# Altium footprint library 3D_MIG_Controller.PCBLIB: 560 footprints (part 17 of 35)
Each footprint in its own frame and in the unit in brackets; x right, y up, seen from the top. Pads: shape width x height; smd on the part's side, far side on the other; paste and mask are expansions set on the pad; w line width, h text height; cw(c..) or ccw(c..) is an arc to the next point about the centre after c.
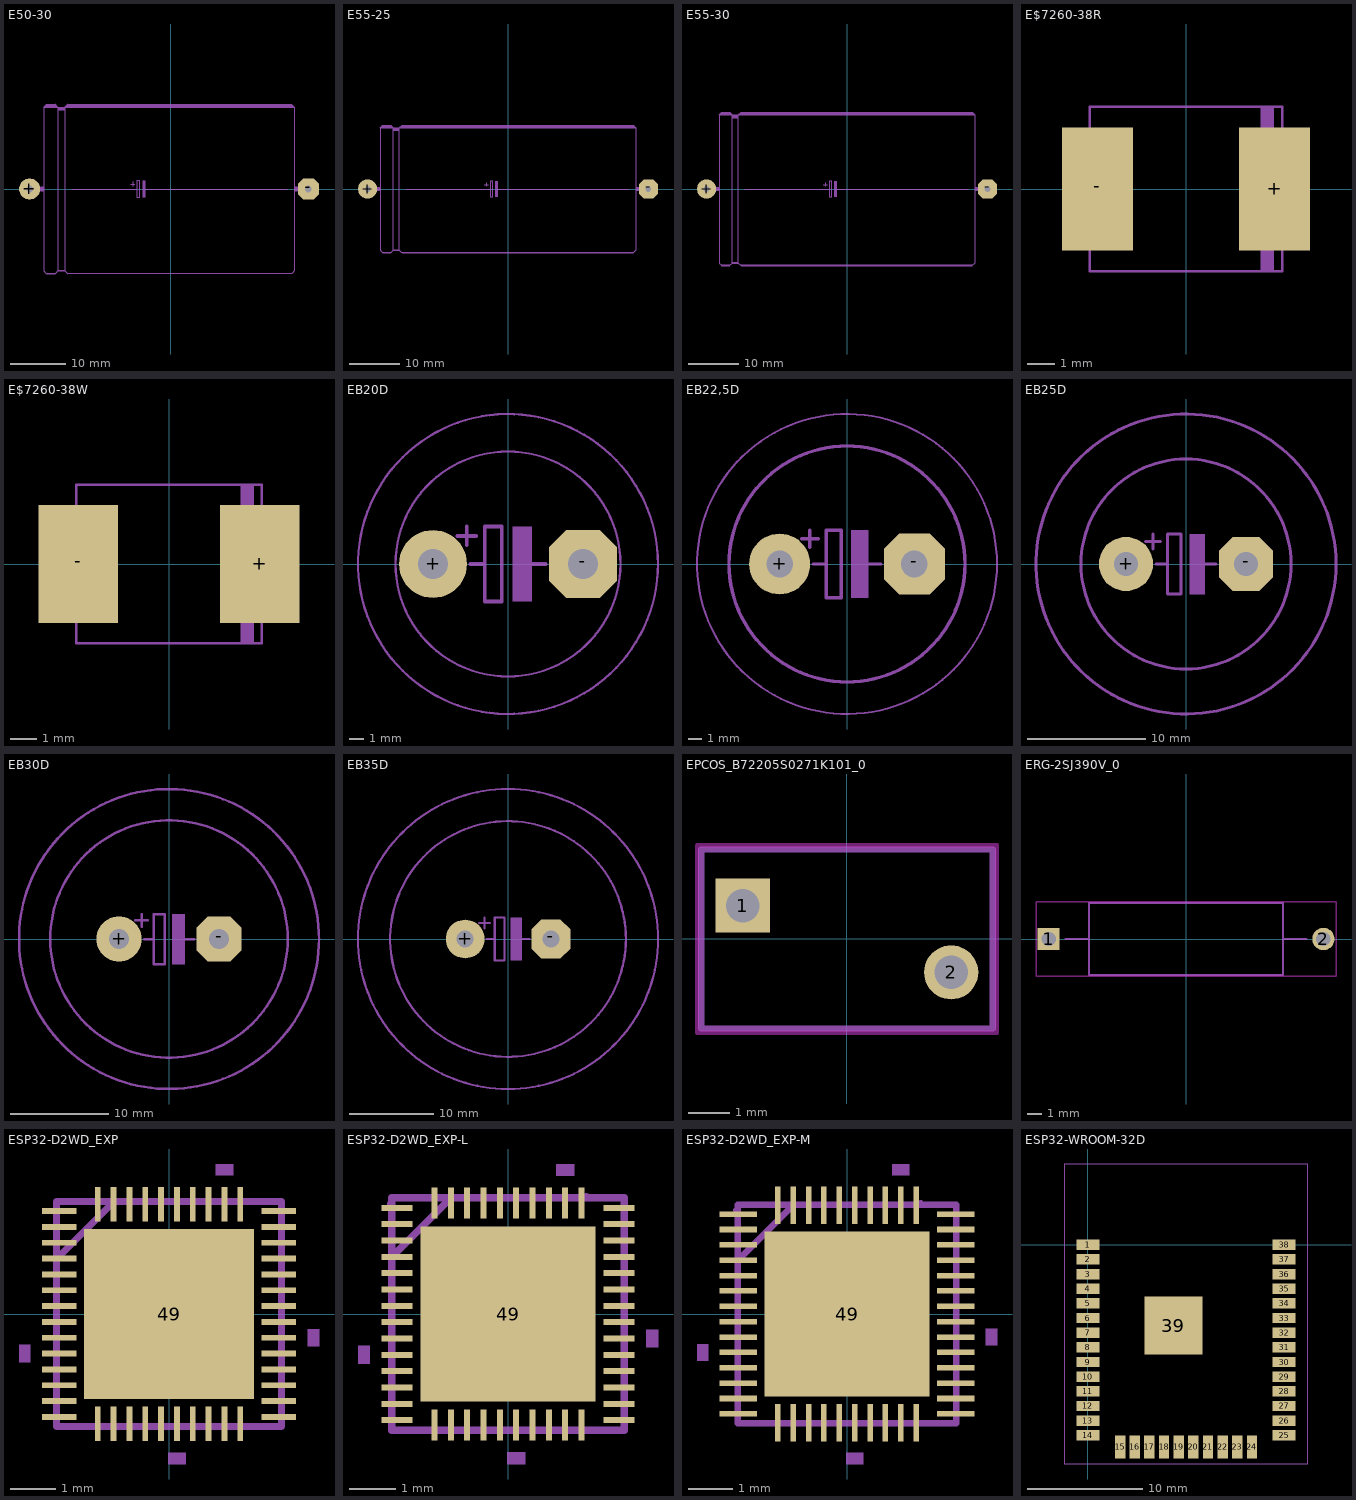
[diagram p16: the footprints below, top view; thin cyan lines are the x and y axes]

## E50-30 [mil]
pads (2):
  round 150 hole 47: +(-1000,0)
  oct 150x150 / inner round 138.58 / far side oct 150x150 hole 47: -(975,0)
tDocu:
  lines w30: -1000,0 -925,0 ; 900,0 975,0
tPlace:
  region: -200,-60 -200,60 -180,60 -180,-60
  region: 875,-15 875,15 895,15 895,-15
  region: -920,-15 -920,15 -900,15 -900,-15
  lines w6: -820,-598 -880,-598 -880,-600 ; -700,0 -240,0 ; -285,35 -255,35 ; -270,20 -270,50 ; -185,0 825,0 ; 855,-598 -730,-598 -730,-600 ; -900,580 -880,600 -820,600 -800,580 ; -900,580 -900,-580 -885,-595 ; -900,580 -800,580 ; -885,-595 -815,-595 ; -885,-595 -880,-600 ; -880,-600 -820,-600 -815,-595 ; -815,-595 -800,-580 ; -800,-580 -750,-580 ; -800,-580 -800,-578 ; -800,-578 -800,-575 ; -800,-578 -750,-578 ; -800,-575 -800,560 ; -800,-575 -750,-575 ; -800,560 -800,580 ; -800,560 -750,560 ; -800,580 -750,580 ; -750,-580 -735,-595 ; -750,-580 -750,-578 ; -750,-578 -750,-575 ; -750,-575 -750,560 ; -750,560 -750,580 ; -750,580 -730,600 855,600 875,580 ; -750,580 875,580 ; -735,-595 860,-595 ; -735,-595 -730,-600 ; -730,-600 855,-600 860,-595 ; -240,0 -240,60 -220,60 -220,-60 -240,-60 -240,0 ; 860,-595 875,-580 875,580
  lines w12: -890,585 -885,585 ; -885,590 -885,585 ; -880,595 -820,595 ; -815,590 -815,585 ; -810,585 -815,585 ; -795,565 -755,565 ; -795,575 -755,575 ; -740,585 -735,585 ; -735,590 -735,585 ; -730,595 855,595 ; 865,585 -735,585 ; -885,585 -815,585

## E55-25 [mil]
pads (2):
  round 150 hole 44: +(-1100,0)
  oct 150x150 / inner round 138.58 / far side oct 150x150 hole 44: -(1100,0)
tDocu:
  lines w30: -1100,0 -1025,0 ; 1025,0 1100,0
tPlace:
  region: -100,-60 -100,60 -80,60 -80,-60
  region: 1000,-15 1000,15 1020,15 1020,-15
  region: -1020,-15 -1020,15 -1000,15 -1000,-15
  lines w6: -920,-498 -980,-498 -980,-500 ; -800,0 -140,0 ; -185,35 -155,35 ; -170,20 -170,50 ; -85,0 950,0 ; 980,-498 -830,-498 -830,-500 ; -1000,480 -980,500 -920,500 -900,480 ; -1000,480 -1000,-480 -985,-495 ; -1000,480 -900,480 ; -985,-495 -915,-495 ; -985,-495 -980,-500 ; -980,-500 -920,-500 -915,-495 ; -915,-495 -900,-480 ; -900,-480 -850,-480 ; -900,-480 -900,-478 ; -900,-478 -850,-478 ; -900,-478 -900,-475 ; -900,-475 -850,-475 ; -900,-475 -900,460 ; -900,460 -900,480 ; -900,460 -850,460 ; -900,480 -850,480 ; -850,-480 -850,-478 ; -850,-480 -835,-495 ; -850,-478 -850,-475 ; -850,-475 -850,460 ; -850,460 -850,480 ; -850,480 -830,500 980,500 1000,480 ; -850,480 1000,480 ; -835,-495 -830,-500 ; -835,-495 985,-495 ; -830,-500 980,-500 985,-495 ; -140,0 -140,60 -120,60 -120,-60 -140,-60 -140,0 ; 985,-495 1000,-480 1000,480
  lines w12: -990,485 -910,485 ; -980,495 -920,495 ; -895,465 -855,465 ; -895,475 -855,475 ; -840,485 990,485 ; -830,495 980,495

## E55-30 [mil]
pads (2):
  round 150 hole 47: +(-1100,0)
  oct 150x150 / inner round 138.58 / far side oct 150x150 hole 47: -(1100,0)
tDocu:
  lines w30: -1100,0 -1025,0 ; 1025,0 1100,0
tPlace:
  region: -100,-60 -100,60 -80,60 -80,-60
  region: 1000,-15 1000,15 1020,15 1020,-15
  region: -1020,-15 -1020,15 -1000,15 -1000,-15
  lines w6: -920,-598 -980,-598 -980,-600 ; -800,0 -140,0 ; -185,35 -155,35 ; -170,20 -170,50 ; -85,0 950,0 ; 980,-598 -830,-598 -830,-600 ; -1000,580 -980,600 -920,600 -900,580 ; -1000,580 -1000,-580 -985,-595 ; -1000,580 -900,580 ; -985,-595 -915,-595 ; -985,-595 -980,-600 ; -980,-600 -920,-600 -915,-595 ; -915,-595 -900,-580 ; -900,-580 -850,-580 ; -900,-580 -900,-578 ; -900,-578 -850,-578 ; -900,-578 -900,-575 ; -900,-575 -850,-575 ; -900,-575 -900,560 ; -900,560 -900,580 ; -900,560 -850,560 ; -900,580 -850,580 ; -850,-580 -850,-578 ; -850,-580 -835,-595 ; -850,-578 -850,-575 ; -850,-575 -850,560 ; -850,560 -850,580 ; -850,580 -830,600 980,600 1000,580 ; -850,580 1000,580 ; -835,-595 -830,-600 ; -835,-595 985,-595 ; -830,-600 980,-600 985,-595 ; -140,0 -140,60 -120,60 -120,-60 -140,-60 -140,0 ; 985,-595 1000,-580 1000,580
  lines w12: -990,585 -910,585 ; -980,595 -920,595 ; -895,565 -855,565 ; -895,575 -855,575 ; -840,585 990,585 ; -830,595 980,595

## E$7260-38R [mil]
pads (2):
  rect 100.39x173.23 smd: +(125,0) -(-125,0)
tDocu:
  region: -143.7,-80.71 -143.7,80.71 -137.8,80.71 -137.8,-80.71
  region: 137.8,-80.71 137.8,80.71 143.7,80.71 143.7,-80.71
  region: 105.32,-117.13 105.32,117.13 124.02,117.13 124.02,-117.13
  lines w4: -135.83,-116.14 135.83,-116.14 135.83,116.14 -135.83,116.14 -135.83,-116.14

## E$7260-38W [mil]
pads (2):
  rect 116.14x173.23 smd: +(132.87,0) -(-132.87,0)
tDocu:
  region: -143.7,-80.71 -143.7,80.71 -137.8,80.71 -137.8,-80.71
  region: 137.8,-80.71 137.8,80.71 143.7,80.71 143.7,-80.71
  region: 105.32,-117.13 105.32,117.13 124.02,117.13 124.02,-117.13
  lines w4: -135.83,-116.14 135.83,-116.14 135.83,116.14 -135.83,116.14 -135.83,-116.14

## EB20D [mil]
pads (2):
  round 181 hole 79: +(-200,0)
  oct 181x181 / inner round 167.22 / far side oct 181x181 hole 79: -(200,0)
tPlace:
  circle w6: c0,0 r400
  circle w6: c0,0 r300
  region: 13,-100 13,100 63,100 63,-100
  lines w10: -135,75 -85,75 ; -110,50 -110,100 ; -100,0 -62,0 ; 25,0 100,0 ; -62,0 -62,100 -17,100 -17,-100 -62,-100 -62,0

## EB22,5D [mil]
pads (2):
  round 181 hole 79: +(-200,0)
  oct 181x181 / inner round 167.22 / far side oct 181x181 hole 79: -(200,0)
tPlace:
  circle w10: c0,0 r350
  circle w6: c0,0 r445
  region: 13,-100 13,100 63,100 63,-100
  lines w10: -135,75 -85,75 ; -110,50 -110,100 ; -100,0 -62,0 ; 25,0 100,0 ; -62,0 -62,100 -17,100 -17,-100 -62,-100 -62,0

## EB25D [mil]
pads (2):
  round 181 hole 79: +(-200,0)
  oct 181x181 / inner round 167.22 / far side oct 181x181 hole 79: -(200,0)
tPlace:
  circle w10: c0,0 r500
  circle w10: c0,0 r350
  region: 13,-100 13,100 63,100 63,-100
  lines w10: -135,75 -85,75 ; -110,50 -110,100 ; -100,0 -62,0 ; 25,0 100,0 ; -62,0 -62,100 -17,100 -17,-100 -62,-100 -62,0

## EB30D [mil]
pads (2):
  round 181 hole 79: +(-200,0)
  oct 181x181 / inner round 167.22 / far side oct 181x181 hole 79: -(200,0)
tPlace:
  circle w10: c0,0 r600
  circle w10: c0,0 r475
  region: 13,-100 13,100 63,100 63,-100
  lines w10: -135,75 -85,75 ; -110,50 -110,100 ; -100,0 -62,0 ; 25,0 100,0 ; -62,0 -62,100 -17,100 -17,-100 -62,-100 -62,0

## EB35D [mil]
pads (2):
  round 181 hole 79: +(-200,0)
  oct 181x181 / inner round 167.22 / far side oct 181x181 hole 79: -(200,0)
tPlace:
  circle w10: c0,0 r700
  circle w10: c0,0 r550
  region: 13,-100 13,100 63,100 63,-100
  lines w10: -135,75 -85,75 ; -110,50 -110,100 ; -100,0 -62,0 ; 55,0 100,0 ; -62,0 -62,100 -17,100 -17,-100 -62,-100 -62,0

## EPCOS_B72205S0271K101_0 [mil]
pads (2):
  rect 51.18x51.18 / inner round 47.28 / far side rect 51.18x51.18 hole 31.5: 1(-98.43,31.5)
  round 51.18 hole 31.5: 2(98.43,-31.5)
Top keep-out:
  lines w3.94: -141.73,-88.58 -141.73,88.58 141.73,88.58 141.73,-88.58 -141.73,-88.58
tDocu:
  lines w5.91: -137.8,-84.65 -137.8,84.65 137.8,84.65 137.8,-84.65 -137.8,-84.65
tPlace:
  lines w5.91: -137.8,-8.86 -137.8,-84.65 137.8,-84.65 137.8,-71.85 ; -137.8,71.85 -137.8,84.65 137.8,84.65 137.8,8.86

## ERG-2SJ390V_0 [mm]
pads (2):
  rect 1.55x1.55 / inner round 1.432 / far side rect 1.55x1.55 hole 1: 1(-9.555,0)
  round 1.55 hole 1: 2(9.555,0)
Top keep-out:
  lines w0.1: -10.43,-2.6 -10.43,2.6 10.43,2.6 10.43,-2.6 -10.43,-2.6
tDocu:
  lines w0.15: -6.75,-2.5 -6.75,2.5 6.75,2.5 6.75,-2.5 -6.75,-2.5
tPlace:
  lines w0.15: -8.38,0 -6.75,0 ; 6.75,0 8.38,0 ; -6.75,-2.5 -6.75,2.5 6.75,2.5 6.75,-2.5 -6.75,-2.5

## ESP32-D2WD_EXP [mil]
pads (49):
  rect 30x5 smd: 1(-95.5,89.57) 2(-95.5,75.79) 3(-95.5,62.01) 4(-95.5,48.23) 5(-95.5,34.45) 6(-95.5,20.67) 7(-95.5,6.89) 8(-95.5,-6.89) 9(-95.5,-20.67) 10(-95.5,-34.45) 11(-95.5,-48.23) 12(-95.5,-62.01) 13(-95.5,-75.79) 14(-95.5,-89.57) 25(95.5,-89.57) 26(95.5,-75.79) 27(95.5,-62.01) 28(95.5,-48.23) 29(95.5,-34.45) 30(95.5,-20.67) 31(95.5,-6.89) 32(95.5,6.89) 33(95.5,20.67) 34(95.5,34.45) 35(95.5,48.23) 36(95.5,62.01) 37(95.5,75.79) 38(95.5,89.57)
  rect 5x30 smd: 15(-62.01,-95.5) 16(-48.23,-95.5) 17(-34.45,-95.5) 18(-20.67,-95.5) 19(-6.89,-95.5) 20(6.89,-95.5) 21(20.67,-95.5) 22(34.45,-95.5) 23(48.23,-95.5) 24(62.01,-95.5) 39(62.01,95.5) 40(48.23,95.5) 41(34.45,95.5) 42(20.67,95.5) 43(6.89,95.5) 44(-6.89,95.5) 45(-20.67,95.5) 46(-34.45,95.5) 47(-48.23,95.5) 48(-62.01,95.5)
  rect 148x148 smd paste+0: 49(0,0)
Top Paste:
  region: -70.06,70.06 -70.06,3.94 -3.94,3.94 -3.94,70.06
  region: -70.06,-3.94 -70.06,-70.06 -3.94,-70.06 -3.94,-3.94
  region: 3.94,70.06 3.94,3.94 70.06,3.94 70.06,70.06
  region: 3.94,-3.94 3.94,-70.06 70.06,-70.06 70.06,-3.94
tDocu:
  lines w6: -98,-93 -98,-86 ; -98,-79 -98,-72 ; -98,-66 -98,-59 ; -98,-52 -98,-45 ; -98,-38 -98,-31 ; -98,-24 -98,-17 ; -98,-10 -98,-3 ; -98,3 -98,10 ; -98,17 -98,24 ; -98,31 -98,38 ; -98,45 -98,52 ; -98,48 -48,98 ; -98,59 -98,66 ; -98,72 -98,79 ; -98,86 -98,93 ; -66,-98 -59,-98 ; -66,98 -59,98 ; -52,-98 -45,-98 ; -52,98 -45,98 ; -38,-98 -31,-98 ; -38,98 -31,98 ; -24,-98 -17,-98 ; -24,98 -17,98 ; -10,-98 -3,-98 ; -10,98 -3,98 ; 3,-98 10,-98 ; 3,98 10,98 ; 17,-98 24,-98 ; 17,98 24,98 ; 31,-98 38,-98 ; 31,98 38,98 ; 45,-98 52,-98 ; 45,98 52,98 ; 59,-98 66,-98 ; 59,98 66,98 ; 98,-93 98,-86 ; 98,-79 98,-72 ; 98,-66 98,-59 ; 98,-52 98,-45 ; 98,-38 98,-31 ; 98,-24 98,-17 ; 98,-10 98,-3 ; 98,3 98,10 ; 98,17 98,24 ; 98,31 98,38 ; 98,45 98,52 ; 98,59 98,66 ; 98,72 98,79 ; 98,86 98,93 ; -98,-98 98,-98 98,98 -98,98 -98,-98
  text "*" at -103,71 h77.5
tPlace:
  region: -130.5,-26.95 -130.5,-41.95 -120.5,-41.95 -120.5,-26.95
  region: -0.61,-120.5 -0.61,-130.5 14.39,-130.5 14.39,-120.5
  region: 130.5,-13.17 130.5,-28.17 120.5,-28.17 120.5,-13.17
  region: 40.73,120.5 40.73,130.5 55.73,130.5 55.73,120.5
  text "*" at -158,71 h77.5

## ESP32-D2WD_EXP-L [mil]
pads (49):
  rect 26x5 smd: 1(-93.5,89.57) 2(-93.5,75.79) 3(-93.5,62.01) 4(-93.5,48.23) 5(-93.5,34.45) 6(-93.5,20.67) 7(-93.5,6.89) 8(-93.5,-6.89) 9(-93.5,-20.67) 10(-93.5,-34.45) 11(-93.5,-48.23) 12(-93.5,-62.01) 13(-93.5,-75.79) 14(-93.5,-89.57) 25(93.5,-89.57) 26(93.5,-75.79) 27(93.5,-62.01) 28(93.5,-48.23) 29(93.5,-34.45) 30(93.5,-20.67) 31(93.5,-6.89) 32(93.5,6.89) 33(93.5,20.67) 34(93.5,34.45) 35(93.5,48.23) 36(93.5,62.01) 37(93.5,75.79) 38(93.5,89.57)
  rect 5x26 smd: 15(-62.01,-93.5) 16(-48.23,-93.5) 17(-34.45,-93.5) 18(-20.67,-93.5) 19(-6.89,-93.5) 20(6.89,-93.5) 21(20.67,-93.5) 22(34.45,-93.5) 23(48.23,-93.5) 24(62.01,-93.5) 39(62.01,93.5) 40(48.23,93.5) 41(34.45,93.5) 42(20.67,93.5) 43(6.89,93.5) 44(-6.89,93.5) 45(-20.67,93.5) 46(-34.45,93.5) 47(-48.23,93.5) 48(-62.01,93.5)
  rect 148x148 smd paste+0: 49(0,0)
Top Paste:
  region: -70.06,70.06 -70.06,3.94 -3.94,3.94 -3.94,70.06
  region: -70.06,-3.94 -70.06,-70.06 -3.94,-70.06 -3.94,-3.94
  region: 3.94,70.06 3.94,3.94 70.06,3.94 70.06,70.06
  region: 3.94,-3.94 3.94,-70.06 70.06,-70.06 70.06,-3.94
tDocu:
  lines w6: -99,93 -98,86 ; -98,-93 -98,-86 ; -98,-79 -98,-72 ; -98,-66 -98,-59 ; -98,-52 -98,-45 ; -98,-38 -98,-31 ; -98,-24 -98,-17 ; -98,-10 -98,-3 ; -98,3 -98,10 ; -98,17 -98,24 ; -98,31 -98,38 ; -98,45 -98,52 ; -98,48 -48,98 ; -98,59 -98,66 ; -98,72 -98,79 ; -66,-98 -59,-98 ; -66,98 -59,98 ; -52,-98 -45,-98 ; -52,98 -45,98 ; -38,-98 -31,-98 ; -38,98 -31,98 ; -24,-98 -17,-98 ; -24,98 -17,98 ; -10,-98 -3,-98 ; -10,98 -3,98 ; 3,-98 10,-98 ; 3,98 10,98 ; 17,-98 24,-98 ; 17,98 24,98 ; 31,-98 38,-98 ; 31,98 38,98 ; 45,-98 52,-98 ; 45,98 52,98 ; 59,-98 66,-98 ; 59,98 66,99 ; 98,-93 98,-86 ; 98,-79 98,-72 ; 98,-66 98,-59 ; 98,-52 98,-45 ; 98,-38 98,-31 ; 98,-24 98,-17 ; 98,-10 98,-3 ; 98,3 98,10 ; 98,17 98,24 ; 98,31 98,38 ; 98,45 98,52 ; 98,59 98,66 ; 98,72 98,79 ; 98,86 98,93 ; -98,-98 98,-98 98,98 -98,98 -98,-98
  text "*" at -103,71 h77.5
tPlace:
  region: -126.5,-26.95 -126.5,-41.95 -116.5,-41.95 -116.5,-26.95
  region: -0.61,-116.5 -0.61,-126.5 14.39,-126.5 14.39,-116.5
  region: 126.5,-13.17 126.5,-28.17 116.5,-28.17 116.5,-13.17
  region: 40.73,116.5 40.73,126.5 55.73,126.5 55.73,116.5
  text "*" at -154,71 h77.5

## ESP32-D2WD_EXP-M [mil]
pads (49):
  rect 34x5 smd: 1(-97.5,89.57) 2(-97.5,75.79) 3(-97.5,62.01) 4(-97.5,48.23) 5(-97.5,34.45) 6(-97.5,20.67) 7(-97.5,6.89) 8(-97.5,-6.89) 9(-97.5,-20.67) 10(-97.5,-34.45) 11(-97.5,-48.23) 12(-97.5,-62.01) 13(-97.5,-75.79) 14(-97.5,-89.57) 25(97.5,-89.57) 26(97.5,-75.79) 27(97.5,-62.01) 28(97.5,-48.23) 29(97.5,-34.45) 30(97.5,-20.67) 31(97.5,-6.89) 32(97.5,6.89) 33(97.5,20.67) 34(97.5,34.45) 35(97.5,48.23) 36(97.5,62.01) 37(97.5,75.79) 38(97.5,89.57)
  rect 5x34 smd: 15(-62.01,-97.5) 16(-48.23,-97.5) 17(-34.45,-97.5) 18(-20.67,-97.5) 19(-6.89,-97.5) 20(6.89,-97.5) 21(20.67,-97.5) 22(34.45,-97.5) 23(48.23,-97.5) 24(62.01,-97.5) 39(62.01,97.5) 40(48.23,97.5) 41(34.45,97.5) 42(20.67,97.5) 43(6.89,97.5) 44(-6.89,97.5) 45(-20.67,97.5) 46(-34.45,97.5) 47(-48.23,97.5) 48(-62.01,97.5)
  rect 148x148 smd paste+0: 49(0,0)
Top Paste:
  region: -70.06,70.06 -70.06,3.94 -3.94,3.94 -3.94,70.06
  region: -70.06,-3.94 -70.06,-70.06 -3.94,-70.06 -3.94,-3.94
  region: 3.94,70.06 3.94,3.94 70.06,3.94 70.06,70.06
  region: 3.94,-3.94 3.94,-70.06 70.06,-70.06 70.06,-3.94
tDocu:
  lines w6: -99,93 -98,86 ; -98,-93 -98,-86 ; -98,-79 -98,-72 ; -98,-66 -98,-59 ; -98,-52 -98,-45 ; -98,-38 -98,-31 ; -98,-24 -98,-17 ; -98,-10 -98,-3 ; -98,3 -98,10 ; -98,17 -98,24 ; -98,31 -98,38 ; -98,45 -98,52 ; -98,48 -48,98 ; -98,59 -98,66 ; -98,72 -98,79 ; -66,-98 -59,-98 ; -66,98 -59,98 ; -52,-98 -45,-98 ; -52,98 -45,98 ; -38,-98 -31,-98 ; -38,98 -31,98 ; -24,-98 -17,-98 ; -24,98 -17,98 ; -10,-98 -3,-98 ; -10,98 -3,98 ; 3,-98 10,-98 ; 3,98 10,98 ; 17,-98 24,-98 ; 17,98 24,98 ; 31,-98 38,-98 ; 31,98 38,98 ; 45,-98 52,-98 ; 45,98 52,98 ; 59,-98 66,-98 ; 59,98 66,99 ; 98,-93 98,-86 ; 98,-79 98,-72 ; 98,-66 98,-59 ; 98,-52 98,-45 ; 98,-38 98,-31 ; 98,-24 98,-17 ; 98,-10 98,-3 ; 98,3 98,10 ; 98,17 98,24 ; 98,31 98,38 ; 98,45 98,52 ; 98,59 98,66 ; 98,72 98,79 ; 98,86 98,93 ; -98,-98 98,-98 98,98 -98,98 -98,-98
  text "*" at -103,71 h77.5
tPlace:
  region: -134.5,-26.95 -134.5,-41.95 -124.5,-41.95 -124.5,-26.95
  region: -0.61,-124.5 -0.61,-134.5 14.39,-134.5 14.39,-124.5
  region: 134.5,-13.17 134.5,-28.17 124.5,-28.17 124.5,-13.17
  region: 40.73,124.5 40.73,134.5 55.73,134.5 55.73,124.5
  text "*" at -162,71 h77.5

## ESP32-WROOM-32D [mm]
pads (39):
  rect 2x0.9 smd: 1(0,0) 2(0,-1.27) 3(0,-2.54) 4(0,-3.81) 5(0,-5.08) 6(0,-6.35) 7(0,-7.62) 8(0,-8.89) 9(0,-10.16) 10(0,-11.43) 11(0,-12.7) 12(0,-13.97) 13(0,-15.24) 14(0,-16.51) 25(17,-16.51) 26(17,-15.24) 27(17,-13.97) 28(17,-12.7) 29(17,-11.43) 30(17,-10.16) 31(17,-8.89) 32(17,-7.62) 33(17,-6.35) 34(17,-5.08) 35(17,-3.81) 36(17,-2.54) 37(17,-1.27) 38(17,0)
  rect 0.9x2 smd: 15(2.785,-17.51) 16(4.055,-17.51) 17(5.325,-17.51) 18(6.595,-17.51) 19(7.865,-17.51) 20(9.135,-17.51) 21(10.405,-17.51) 22(11.675,-17.51) 23(12.945,-17.51) 24(14.215,-17.51)
  rect 5x5 smd: 39(7.415,-7)
tPlace:
  lines w0.1: -2,-19 -2,7 19,7 19,-19 -2,-19
  text "*" at 1.7,-1.3 h2.6